# Altium footprint library Miscellaneous Devices.PcbLib: 291 footprints (part 4 of 19)
Each footprint in its own frame and in the unit in brackets; x right, y up, seen from the top. Pads: shape width x height; smd on the part's side, far side on the other; paste and mask are expansions set on the pad; w line width, h text height; cw(c..) or ccw(c..) is an arc to the next point about the centre after c.
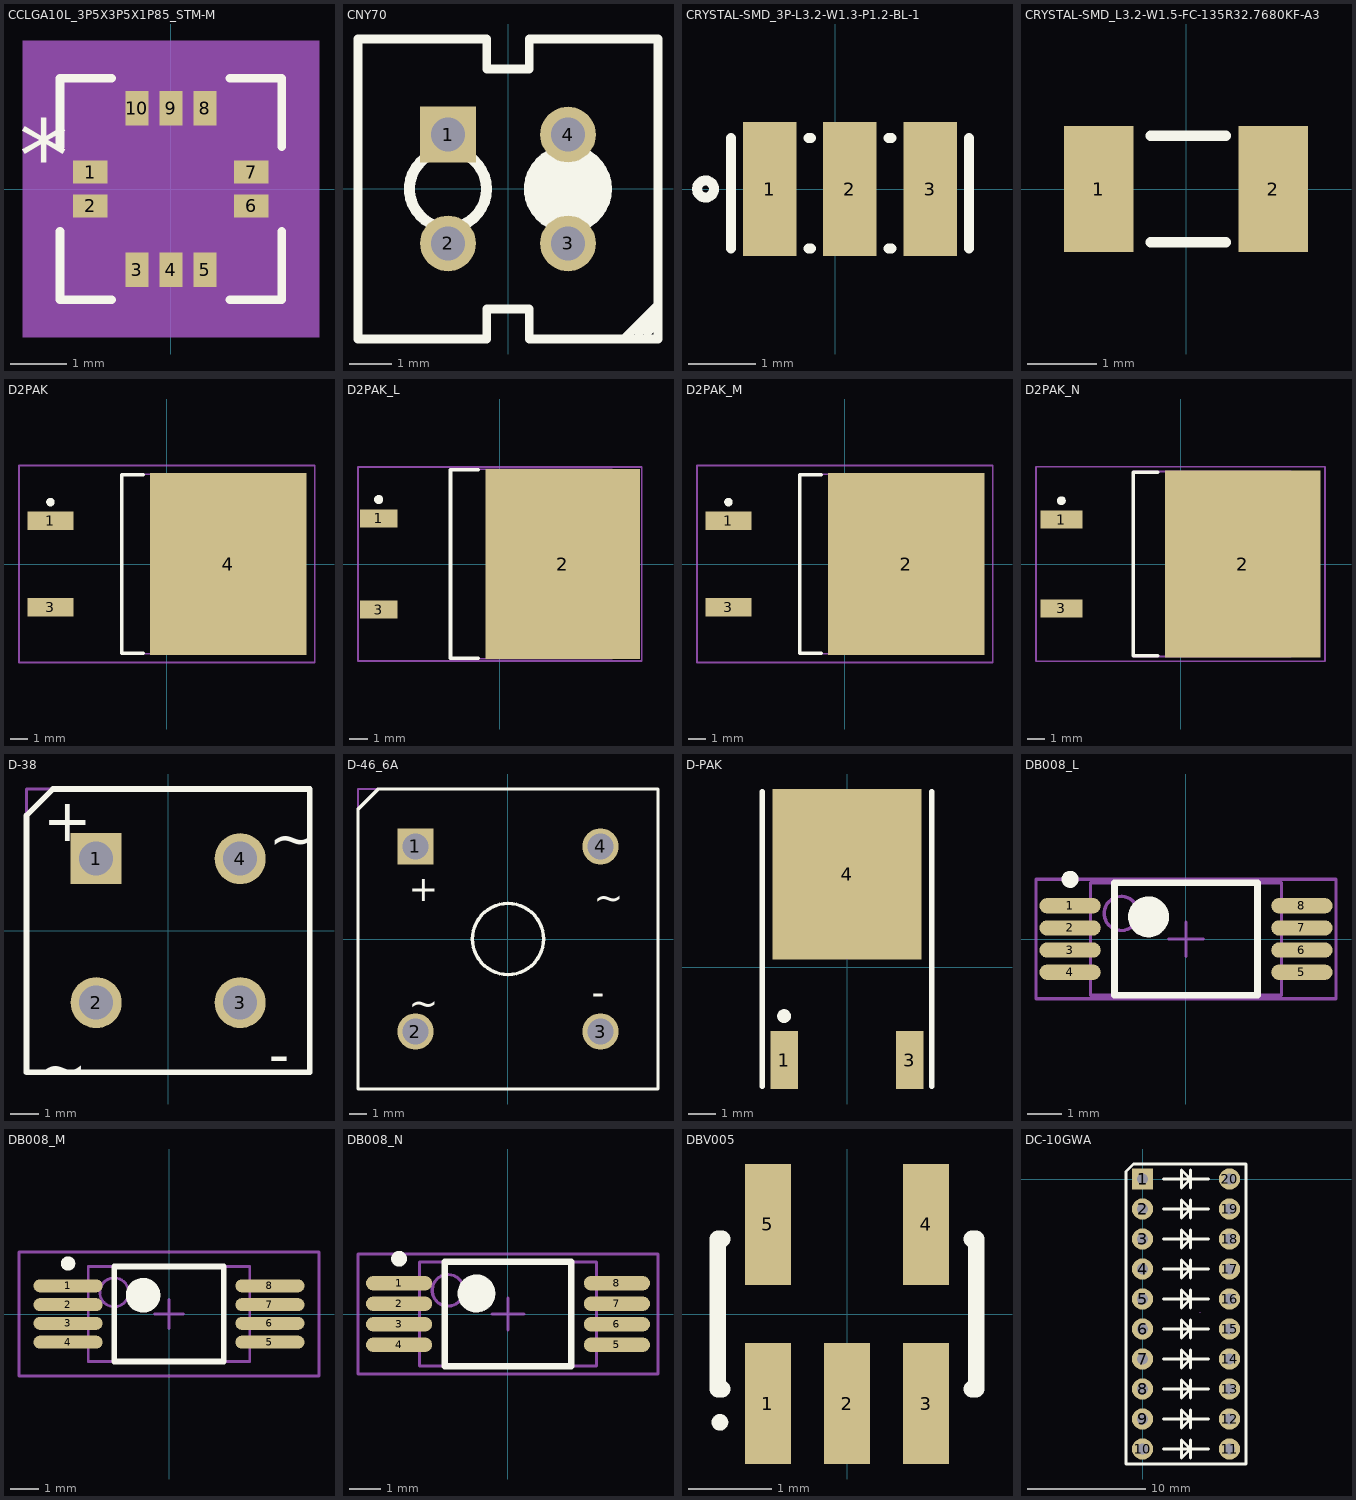
[diagram p3: the footprints below, top view; thin cyan lines are the x and y axes]

## CCLGA10L_3P5X3P5X1P85_STM-M [mil]
pads (10):
  rect 23.94x15.97 smd paste+0 mask+0: 1(-56,11.81) 2(-56,-11.81) 6(56,-11.81) 7(56,11.81)
  rect 15.97x23.94 smd paste+0 mask+0: 3(-23.62,-56) 4(0,-56) 5(23.62,-56) 8(23.62,56) 9(0,56) 10(-23.62,56)
Top Overlay:
  lines w6: -77,-29.28 -77,-77 -41.1,-77 ; -77,29.28 -77,77 -41.1,77 ; 41.1,-77 77,-77 77,-29.28 ; 41.1,77 77,77 77,29.28
  text "*" at -105.47,-1.38 h50
Mechanical 5:
  region: 102.97,-102.97 -102.97,-102.97 -102.97,102.97 102.97,102.97
Mechanical 13:
  lines w1: -72,22 -22,72 ; -72,-72 -72,72 72,72 72,-72 -72,-72 ; -72,-18.81 -66,-18.81 -66,-4.81 -72,-4.81 -72,-18.81 ; -72,4.81 -66,4.81 -66,18.81 -72,18.81 -72,4.81 ; -30.62,-72 -30.62,-66 -16.62,-66 -16.62,-72 -30.62,-72 ; -30.62,66 -30.62,72 -16.62,72 -16.62,66 -30.62,66 ; -7,-72 -7,-66 7,-66 7,-72 -7,-72 ; -7,66 -7,72 7,72 7,66 -7,66 ; 16.62,-72 16.62,-66 30.62,-66 30.62,-72 16.62,-72 ; 16.62,66 16.62,72 30.62,72 30.62,66 16.62,66 ; 66,-18.81 66,-4.81 72,-4.81 72,-18.81 66,-18.81 ; 66,4.81 66,18.81 72,18.81 72,4.81 66,4.81
  text "*" at -56.53,-1.38 h50
Mechanical 15:
  region: -51.61,-92 -92,-92 -92,-39.8 -92,39.8 -92,92 -51.61,92 51.61,92 92,92 92,39.8 92,-39.8 92,-92 51.61,-92
  lines w6: -92,-92 -51.61,-92 51.61,-92 92,-92 92,-39.8 92,39.8 92,92 51.61,92 -51.61,92 -92,92 -92,39.8 -92,-39.8 -92,-92
3D body: height 10, standoff 0, extent -63.98,-64.96 62.99,63.98

## CNY70 [mm] "Axial Device, Thru-Hole; 2 Leads; 0.3 in Pin Spacing"
height 1.524
pads (4):
  rect 1.3x1.3 hole 0.8: 1(-1.4,1.27)
  round 1.3 hole 0.8: 2(-1.4,-1.27) 3(1.4,-1.27) 4(1.4,1.27)
Top Overlay:
  circle w0.254: c1.4,0 r0.9
  circle w0.254: c-1.4,0 r0.9
  lines w0.2: -0.5,-3.5 -3.5,-3.5 -3.5,3.5 -0.5,3.5 -0.5,2.8 ; -0.5,-3.45 -0.5,-2.8 0.45,-2.8 ; -0.45,2.8 0.5,2.8 0.5,3.45 ; 0.5,-2.8 0.5,-3.5 3.5,-3.5 3.5,3.5 0.5,3.5 ; 2.7,-3.5 3.5,-2.7 ; 3.05,-3.35 3.4,-3 ; 3.25,-3.35 3.4,-3.2
  lines w0.254: 0.5,-0.1 2.2,-0.1 ; 0.6,-0.3 2.1,-0.3 ; 0.6,0.1 2.1,0.1 ; 0.7,0.3 2.2,0.3 ; 0.8,-0.5 2,-0.5 ; 0.8,0.5 2.1,0.5 ; 1.3,-0.7 1.3,0.8 ; 1.7,-0.6 0.9,-0.6 0.9,0.7 1.8,0.7 1.8,-0.7
3D body "User Library-cny70-1.step": height 6, standoff -5.75, extent -3.5,-3.6 3.5,3.4

## CRYSTAL-SMD_3P-L3.2-W1.3-P1.2-BL-1 [mm]
pads (3):
  rect 0.8x2 smd paste+0 mask+0.051: 1(-0.984,0) 2(0.216,0) 3(1.416,0)
Top Overlay:
  circle w0.15: c-1.943,0 r0.127
  lines w0.15: -1.563,-0.889 -1.562,-0.889 -1.562,0.762 -1.563,0.762 ; -0.405,-0.889 -0.363,-0.889 ; -0.405,0.762 -0.363,0.762 ; 0.795,-0.889 0.837,-0.889 ; 0.795,0.762 0.837,0.762 ; 1.995,-0.889 1.994,-0.889 1.994,0.762 1.995,0.762
3D body "User Library-CSTCE_V-1.STEP": height 1.02, standoff -0.09, extent -1.4,-0.7 1.8,0.6

## CRYSTAL-SMD_L3.2-W1.5-FC-135R32.7680KF-A3 [mm]
pads (2):
  rect 1x1.8 smd paste+0 mask+0.05: 1(-1.25,0) 2(1.25,0)
Top Overlay:
  lines w0.15: -0.508,-0.762 0.571,-0.762 ; -0.508,0.762 0.571,0.762

## D2PAK [mm] "D2-PAK, 4-Leads, Body 8.8x10.4mm, Pitch 2.54mm, Lead Span 15.1mm, IPC Low Density"
height 4.69
pads (3):
  rect 2.7x1.1 smd: 1(-6.85,2.54) 3(-6.85,-2.54)
  rect 9.2x10.7 smd: 4(3.6,0)
Top Overlay:
  circle w0.25: c-6.85,3.64 r0.125
  lines w0.2: -1.4,-5.25 -2.65,-5.25 -2.65,5.25 -1.4,5.25
Mechanical 13:
  lines w0.1: -2.65,-5.275 6.35,-5.275 6.35,5.275 -2.65,5.275 -2.65,-5.275
Mechanical 15:
  lines w0.1: -0.5,0 0.5,0 ; 0,-0.5 0,0.5 ; -8.7,-5.8 8.7,-5.8 8.7,5.8 -8.7,5.8 -8.7,-5.8
3D body: height 4.69, standoff 0, extent -2.65,-5.275 6.35,5.275

## D2PAK_L [mm] "D2-PAK, 4-Leads, Body 8.8x10.4mm, Pitch 2.54mm, Lead Span 15.1mm, IPC High Density"
height 4.69
pads (3):
  rect 2.1x1 smd: 1(-6.75,2.54) 3(-6.75,-2.54)
  rect 8.6x10.6 smd: 2(3.5,0)
Top Overlay:
  circle w0.25: c-6.75,3.59 r0.125
  lines w0.2: -1.2,-5.25 -2.75,-5.25 -2.75,5.25 -1.2,5.25
Mechanical 13:
  lines w0.1: -2.75,-5.275 -2.75,5.275 6.25,5.275 6.25,-5.275 -2.75,-5.275
Mechanical 15:
  lines w0.1: -0.5,0 0.5,0 ; 0,-0.5 0,0.5 ; -7.9,-5.4 -7.9,5.4 7.9,5.4 7.9,-5.4 -7.9,-5.4
3D body: height 4.69, standoff 0, extent -2.75,-5.275 6.25,5.275

## D2PAK_M [mm] "D2-PAK, 4-Leads, Body 8.8x10.4mm, Pitch 2.54mm, Lead Span 15.1mm, IPC Low Density"
height 4.69
pads (3):
  rect 2.7x1.1 smd: 1(-6.85,2.54) 3(-6.85,-2.54)
  rect 9.2x10.7 smd: 2(3.6,0)
Top Overlay:
  circle w0.25: c-6.85,3.64 r0.125
  lines w0.2: -1.4,-5.25 -2.65,-5.25 -2.65,5.25 -1.4,5.25
Mechanical 13:
  lines w0.1: -2.65,-5.275 6.35,-5.275 6.35,5.275 -2.65,5.275 -2.65,-5.275
Mechanical 15:
  lines w0.1: -0.5,0 0.5,0 ; 0,-0.5 0,0.5 ; -8.7,-5.8 8.7,-5.8 8.7,5.8 -8.7,5.8 -8.7,-5.8
3D body: height 4.69, standoff 0, extent -2.65,-5.275 6.35,5.275

## D2PAK_N [mm] "D2-PAK, 4-Leads, Body 8.8x10.4mm, Pitch 2.54mm, Lead Span 15.1mm, IPC Medium Density"
height 4.69
pads (3):
  rect 2.4x1.05 smd: 1(-6.8,2.54) 3(-6.8,-2.54)
  rect 8.9x10.65 smd: 2(3.55,0)
Top Overlay:
  circle w0.25: c-6.8,3.615 r0.125
  lines w0.2: -1.3,-5.25 -2.7,-5.25 -2.7,5.25 -1.3,5.25
Mechanical 13:
  lines w0.1: -2.7,-5.275 -2.7,5.275 6.3,5.275 6.3,-5.275 -2.7,-5.275
Mechanical 15:
  lines w0.1: -0.5,0 0.5,0 ; 0,-0.5 0,0.5 ; -8.25,-5.55 -8.25,5.55 8.25,5.55 8.25,-5.55 -8.25,-5.55
3D body: height 4.69, standoff 0, extent -2.7,-5.275 6.3,5.275

## D-38 [mm] "Bridge Rectifier; 4 Terminals; Body 9.4 x 9.4 mm (typ); Pitch 5.08 mm"
height 9.91
pads (4):
  rect 1.8x1.8 hole 1.2: 1(-2.54,2.54)
  round 1.8 hole 1.2: 2(-2.54,-2.54) 3(2.54,-2.54) 4(2.54,2.54)
Top Overlay:
  lines w0.2: -5,-5 -5,4.064 -4.064,5 5,5 5,-5 -5,-5
  text "+" at -4.41,3.164 h1.5
  text "-" at 3.556,-5.08 h1.5
  text "~" at -4.572,-5.588 h1.5
  text "~" at 3.556,2.54 h1.5
Mechanical 13:
  lines w0.1: -5,-5 -5,5 5,5 5,-5 -5,-5
3D body: height 9.91, standoff 0, extent -5,-5 5,5

## D-46_6A [mm] "Bridge Rectifier; 4 Terminals; Body 16.8 x 16.8 mm (typ); Pitch 10.67 mm"
height 6.35
pads (4):
  rect 2.1x2.1 hole 1.5: 1(-5.335,5.335)
  round 2.1 hole 1.5: 2(-5.335,-5.335) 3(5.335,-5.335) 4(5.335,5.335)
Top Overlay:
  circle w0.2: c0,0 r2.05
  lines w0.2: -8.65,-8.65 8.65,-8.65 8.65,8.65 -7.474,8.65 -8.65,7.474 -8.65,-8.65
  text "~" at -5.723,-4.437 h1.5
  text "~" at 4.945,1.659 h1.5
  text "-" at 4.825,-3.809 h1.5
  text "+" at -5.723,2.167 h1.5
Mechanical 13:
  lines w0.1: -8.65,-8.65 -8.65,8.65 8.65,8.65 8.65,-8.65 -8.65,-8.65
3D body: height 6.35, standoff 0, extent -8.65,-8.65 8.65,8.65

## D-PAK [mm] "D-PAK/TO-252-AA; 3 Leads (1 Cropped); Body 10.1 (inc. leads) x 6.6 mm (LxW max)"
height 2.4
pads (3):
  rect 1x2.1 smd: 1(-2.285,-3.375) 3(2.285,-3.375)
  rect 5.4x6.2 smd: 4(0,3.375)
Top Overlay:
  circle w0.25: c-2.285,-1.775 r0.125
  lines w0.2: -3.085,-4.325 -3.085,6.375 ; 3.085,-4.325 3.085,6.375
3D body "User Library-D-PAK.STEP": height 2.3, standoff 0, extent -3.246,-3.55 3.247,5.95

## DB008_L [mm] "SOP, 8-Leads, Body 3x5.3mm, Pitch 0.65mm, IPC High Density"
height 2
pads (8):
  oval 1.8x0.45 smd: 1(-3.4,0.975) 2(-3.4,0.325) 3(-3.4,-0.325) 4(-3.4,-0.975) 5(3.4,-0.975) 6(3.4,-0.325) 7(3.4,0.325) 8(3.4,0.975)
Top Overlay:
  circle w0.6: c-1.1,0.65 r0.3
  circle w0.25: c-3.4,1.75 r0.125
  lines w0.2: -2.1,-1.65 2.1,-1.65 2.1,1.65 -2.1,1.65 -2.1,-1.65
Mechanical 13:
  circle w0.1: c-1.9,0.75 r0.5
  lines w0.1: -2.8,-1.65 2.8,-1.65 2.8,1.65 -2.8,1.65 -2.8,-1.65
Mechanical 15:
  lines w0.1: -0.5,0 0.5,0 ; 0,-0.5 0,0.5 ; -4.4,-1.75 4.4,-1.75 4.4,1.75 -4.4,1.75 -4.4,-1.75
3D body: height 2, standoff 0, extent -2.8,-1.65 2.8,1.65

## DB008_M [mm] "SOP, 8-Leads, Body 3x5.3mm, Pitch 0.65mm, IPC Low Density"
height 2
pads (8):
  oval 2.4x0.45 smd: 1(-3.5,0.975) 2(-3.5,0.325) 3(-3.5,-0.325) 4(-3.5,-0.975) 5(3.5,-0.975) 6(3.5,-0.325) 7(3.5,0.325) 8(3.5,0.975)
Top Overlay:
  circle w0.25: c-3.5,1.75 r0.125
  circle w0.6: c-0.9,0.65 r0.3
  lines w0.2: -1.9,-1.65 -1.9,1.65 1.9,1.65 1.9,-1.65 -1.9,-1.65
Mechanical 13:
  circle w0.1: c-1.9,0.75 r0.5
  lines w0.1: -2.8,-1.65 -2.8,1.65 2.8,1.65 2.8,-1.65 -2.8,-1.65
Mechanical 15:
  lines w0.1: -0.5,0 0.5,0 ; 0,-0.5 0,0.5 ; -5.2,-2.15 -5.2,2.15 5.2,2.15 5.2,-2.15 -5.2,-2.15
3D body: height 2, standoff 0, extent -2.8,-1.65 2.8,1.65

## DB008_N [mm] "SOP, 8-Leads, Body 3x5.3mm, Pitch 0.65mm, IPC Medium Density"
height 2
pads (8):
  oval 2.1x0.45 smd: 1(-3.45,0.975) 2(-3.45,0.325) 3(-3.45,-0.325) 4(-3.45,-0.975) 5(3.45,-0.975) 6(3.45,-0.325) 7(3.45,0.325) 8(3.45,0.975)
Top Overlay:
  circle w0.6: c-1,0.65 r0.3
  circle w0.25: c-3.45,1.75 r0.125
  lines w0.2: -2,-1.65 2,-1.65 2,1.65 -2,1.65 -2,-1.65
Mechanical 13:
  circle w0.1: c-1.9,0.75 r0.5
  lines w0.1: -2.8,-1.65 2.8,-1.65 2.8,1.65 -2.8,1.65 -2.8,-1.65
Mechanical 15:
  lines w0.1: -0.5,0 0.5,0 ; 0,-0.5 0,0.5 ; -4.75,-1.9 4.75,-1.9 4.75,1.9 -4.75,1.9 -4.75,-1.9
3D body: height 2, standoff 0, extent -2.8,-1.65 2.8,1.65

## DBV005 [mm] "SOT-23/SC-74A; 5 Leads; Body 3 x 3 mm, inc. leads (LxW max)"
height 1.45
pads (5):
  rect 0.55x1.45 smd: 1(-0.95,-1.075) 2(0,-1.075) 3(0.95,-1.075) 4(0.95,1.075) 5(-0.95,1.075)
Top Overlay:
  circle w0.1: c-1.525,-1.3 r0.05
  lines w0.2: -1.5,-0.9 -1.55,-0.9 -1.55,0.9 -1.5,0.9 ; 1.5,-0.9 1.55,-0.9 1.55,0.9 1.5,0.9
3D body "SW3DPS-SOT-23-5-DEFAULT.STEP": height 1.1, standoff 0, extent -1.5,-1.35 1.5,1.15

## DC-10GWA [mm]
height 6.34
pads (20):
  rect 1.8x1.8 hole 0.9 paste+0 mask+0.051: 1(-0.025,0)
  round 1.8 hole 0.9 paste+0 mask+0.051: 2(-0.025,-2.54) 3(-0.025,-5.08) 4(-0.025,-7.62) 5(-0.025,-10.16) 6(-0.025,-12.7) 7(-0.025,-15.24) 8(-0.025,-17.78) 9(-0.025,-20.32) 10(-0.025,-22.86) 11(7.341,-22.86) 12(7.341,-20.32) 13(7.341,-17.78) 14(7.341,-15.24) 15(7.341,-12.7) 16(7.341,-10.16) 17(7.341,-7.62) 18(7.341,-5.08) 19(7.341,-2.54) 20(7.341,0)
Top Overlay:
  lines w0.254: 1.753,-22.86 5.563,-22.86 ; 1.753,-20.32 5.563,-20.32 ; 1.753,-17.78 5.563,-17.78 ; 1.753,-15.24 5.563,-15.24 ; 1.753,-12.7 5.563,-12.7 ; 1.753,-10.16 5.563,-10.16 ; 1.753,-7.62 5.563,-7.62 ; 1.753,-5.08 5.563,-5.08 ; 1.753,-2.54 5.563,-2.54 ; 1.753,0 5.563,0 ; 4.039,-23.622 4.039,-22.098 ; 4.039,-21.082 4.039,-19.558 ; 4.039,-18.542 4.039,-17.018 ; 4.039,-16.002 4.039,-14.478 ; 4.039,-13.462 4.039,-11.938 ; 4.039,-10.922 4.039,-9.398 ; 4.039,-8.382 4.039,-6.858 ; 4.039,-5.842 4.039,-4.318 ; 4.039,-3.302 4.039,-1.778 ; 4.039,-0.762 4.039,0.762 ; -1.422,-24.13 8.738,-24.13 8.738,1.27 -0.787,1.27 -1.422,0.635 -1.422,-24.13 ; 3.277,-23.622 3.277,-22.098 4.039,-22.86 3.277,-23.622 ; 3.277,-21.082 4.039,-20.32 3.277,-19.558 3.277,-21.082 ; 3.277,-18.542 3.277,-17.018 4.039,-17.78 3.277,-18.542 ; 3.277,-16.002 3.277,-14.478 4.039,-15.24 3.277,-16.002 ; 3.277,-13.462 4.039,-12.7 3.277,-11.938 3.277,-13.462 ; 3.277,-10.922 3.277,-9.398 4.039,-10.16 3.277,-10.922 ; 3.277,-8.382 3.277,-6.858 4.039,-7.62 3.277,-8.382 ; 3.277,-5.842 3.277,-4.318 4.039,-5.08 3.277,-5.842 ; 3.277,-3.302 3.277,-1.778 4.039,-2.54 3.277,-3.302 ; 3.277,-0.762 3.277,0.762 4.039,0 3.277,-0.762
Mechanical 15:
  lines w0.003: 4.864,-11.303 4.865,-11.303
3D body "User Library-DC-10GWA.STEP": height 8, standoff -3, extent -1.48,-24.1 8.68,1.3